# Altium footprint library Connectors.PcbLib: 131 footprints (part 2 of 9)
Each footprint in its own frame and in the unit in brackets; x right, y up, seen from the top. Pads: shape width x height; smd on the part's side, far side on the other; paste and mask are expansions set on the pad; w line width, h text height; cw(c..) or ccw(c..) is an arc to the next point about the centre after c.
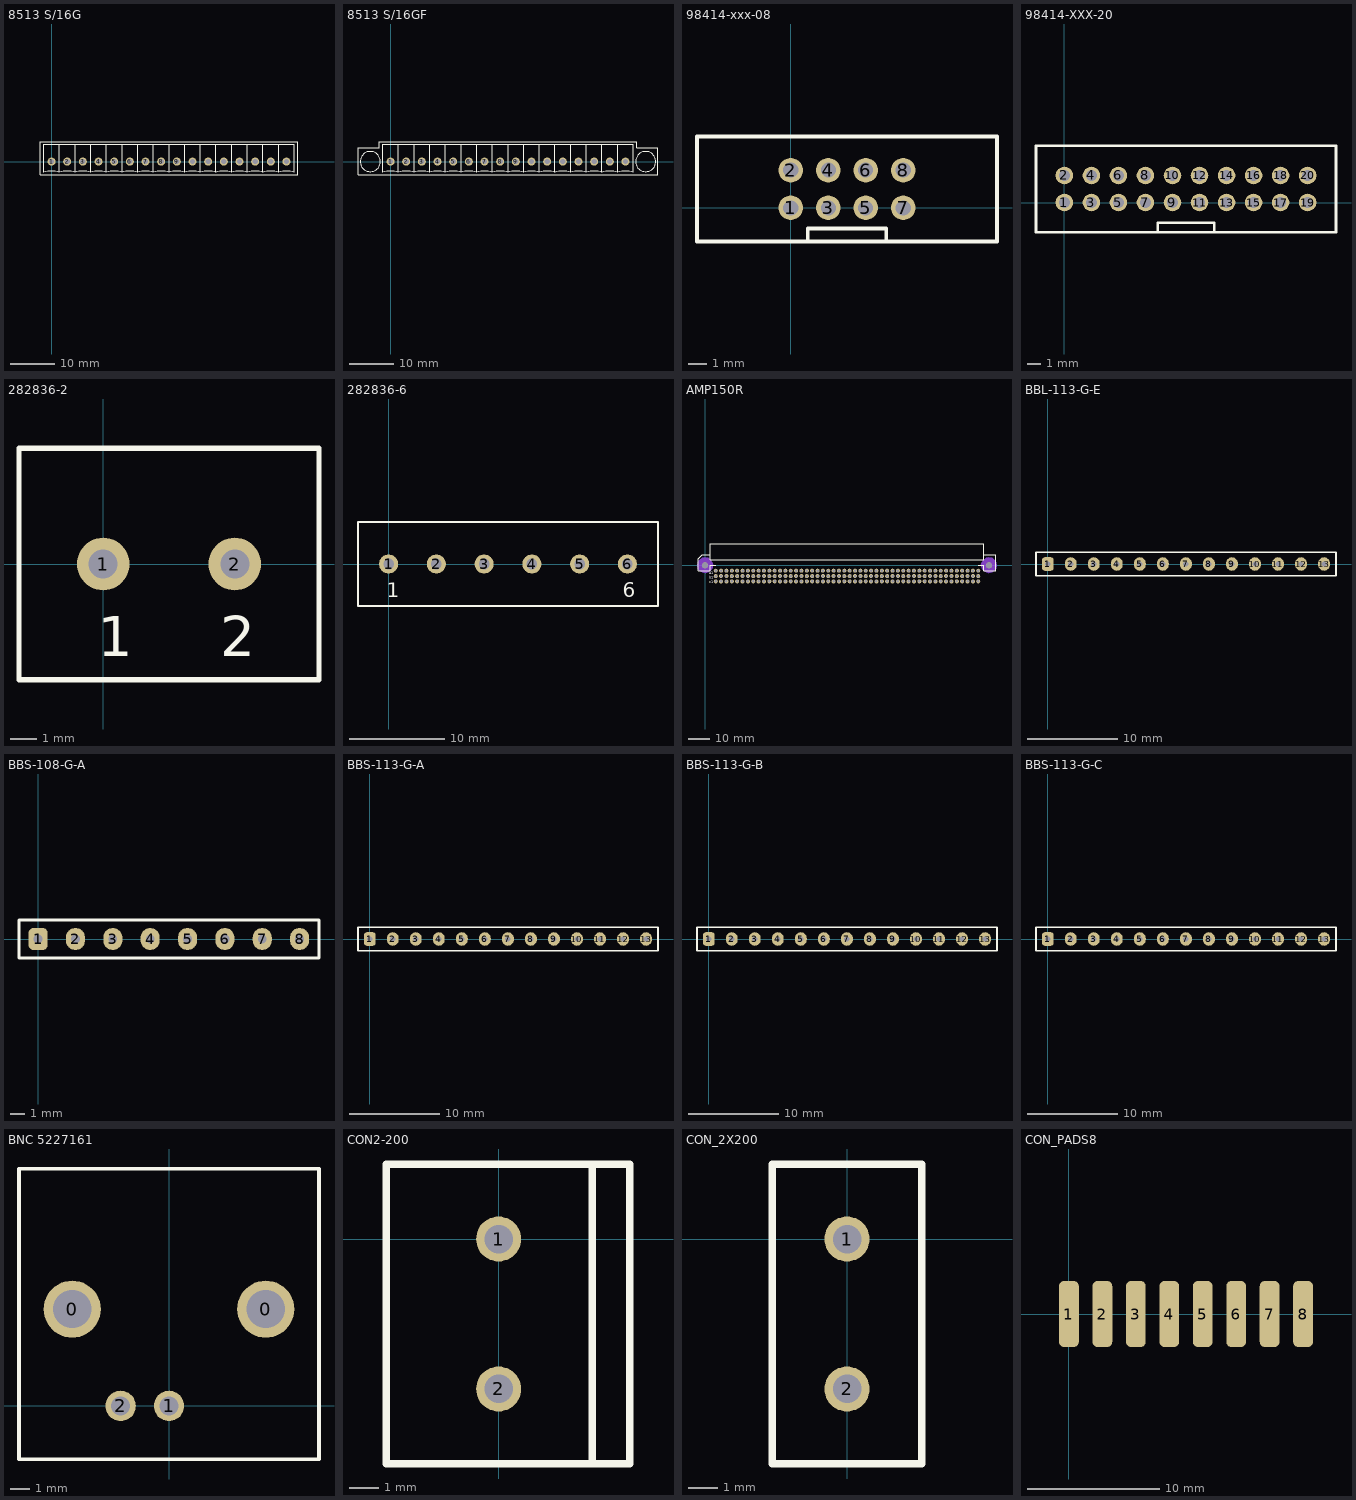
[diagram p1: the footprints below, top view; thin cyan lines are the x and y axes]

## 8513 S/16G [mm]
pads (16):
  round 1.8 hole 1.2: 1(0,0) 2(3.5,0) 3(7,0) 4(10.5,0) 5(14,0) 6(17.5,0) 7(21,0) 8(24.5,0) 9(28,0) 10(31.5,0) 11(35,0) 12(38.5,0) 13(42,0) 14(45.5,0) 15(49,0) 16(52.5,0)
Top Overlay:
  lines w0.254: -1.75,-2.35 -1.75,3.85 53.85,3.85 54.25,3.85 54.25,-2.35 ; -1.745,-2.349 cw(c0,-9.4) 1.745,-2.349 ; 1.75,-2.35 1.75,3.85 ; 1.755,-2.349 cw(c3.5,-9.4) 5.245,-2.349 ; 5.25,-2.35 5.25,3.85 ; 5.255,-2.349 cw(c7,-9.4) 8.745,-2.349 ; 8.75,-2.35 8.75,3.85 ; 8.755,-2.349 cw(c10.5,-9.4) 12.245,-2.349 ; 12.25,-2.35 12.25,3.85 ; 12.255,-2.349 cw(c14,-9.4) 15.745,-2.349 ; 15.75,-2.35 15.75,3.85 ; 15.755,-2.349 cw(c17.5,-9.4) 19.245,-2.349 ; 19.25,-2.35 19.25,3.85 ; 19.255,-2.349 cw(c21,-9.4) 22.745,-2.349 ; 22.75,-2.35 22.75,3.85 ; 22.755,-2.349 cw(c24.5,-9.4) 26.245,-2.349 ; 26.25,-2.35 26.25,3.85 ; 26.255,-2.349 cw(c28,-9.4) 29.745,-2.349 ; 29.75,-2.35 29.75,3.85 ; 29.755,-2.349 cw(c31.5,-9.4) 33.245,-2.349 ; 33.25,-2.35 33.25,3.85 ; 33.255,-2.349 cw(c35,-9.4) 36.745,-2.349 ; 36.75,-2.35 36.75,3.85 ; 36.755,-2.349 cw(c38.5,-9.4) 40.245,-2.349 ; 40.25,-2.35 40.25,3.85 ; 40.255,-2.349 cw(c42,-9.4) 43.745,-2.349 ; 43.75,-2.35 43.75,3.85 ; 43.755,-2.349 cw(c45.5,-9.4) 47.245,-2.349 ; 47.25,-2.35 47.25,3.85 ; 47.255,-2.349 cw(c49,-9.4) 50.745,-2.349 ; 50.75,-2.35 50.75,3.85 ; 50.755,-2.349 cw(c52.5,-9.4) 54.245,-2.349 ; -2.5,-2.9 55,-2.9 55,4.4 -2.5,4.4 -2.5,-2.9
Top Assembly:
  text ".Designator" at 31.248,0.417 h1

## 8513 S/16GF [mm]
pads (16):
  round 1.8 hole 1.2: 1(0,0) 2(3.5,0) 3(7,0) 4(10.5,0) 5(14,0) 6(17.5,0) 7(21,0) 8(24.5,0) 9(28,0) 10(31.5,0) 11(35,0) 12(38.5,0) 13(42,0) 14(45.5,0) 15(49,0) 16(52.5,0)
Top Overlay:
  circle w0.254: c57,0 r2.25
  circle w0.254: c-4.5,0 r2.25
  lines w0.254: -1.75,-2.35 -1.75,3.85 53.85,3.85 54.25,3.85 54.25,-2.35 ; -1.745,-2.349 cw(c0,-9.4) 1.745,-2.349 ; 1.75,-2.35 1.75,3.85 ; 1.755,-2.349 cw(c3.5,-9.4) 5.245,-2.349 ; 5.25,-2.35 5.25,3.85 ; 5.255,-2.349 cw(c7,-9.4) 8.745,-2.349 ; 8.75,-2.35 8.75,3.85 ; 8.755,-2.349 cw(c10.5,-9.4) 12.245,-2.349 ; 12.25,-2.35 12.25,3.85 ; 12.255,-2.349 cw(c14,-9.4) 15.745,-2.349 ; 15.75,-2.35 15.75,3.85 ; 15.755,-2.349 cw(c17.5,-9.4) 19.245,-2.349 ; 19.25,-2.35 19.25,3.85 ; 19.255,-2.349 cw(c21,-9.4) 22.745,-2.349 ; 22.75,-2.35 22.75,3.85 ; 22.755,-2.349 cw(c24.5,-9.4) 26.245,-2.349 ; 26.25,-2.35 26.25,3.85 ; 26.255,-2.349 cw(c28,-9.4) 29.745,-2.349 ; 29.75,-2.35 29.75,3.85 ; 29.755,-2.349 cw(c31.5,-9.4) 33.245,-2.349 ; 33.25,-2.35 33.25,3.85 ; 33.255,-2.349 cw(c35,-9.4) 36.745,-2.349 ; 36.75,-2.35 36.75,3.85 ; 36.755,-2.349 cw(c38.5,-9.4) 40.245,-2.349 ; 40.25,-2.35 40.25,3.85 ; 40.255,-2.349 cw(c42,-9.4) 43.745,-2.349 ; 43.75,-2.35 43.75,3.85 ; 43.755,-2.349 cw(c45.5,-9.4) 47.245,-2.349 ; 47.25,-2.35 47.25,3.85 ; 47.255,-2.349 cw(c49,-9.4) 50.745,-2.349 ; 50.75,-2.35 50.75,3.85 ; 50.755,-2.349 cw(c52.5,-9.4) 54.245,-2.349 ; -7.2,-2.9 59.7,-2.9 59.7,3.1 55,3.1 55,4.4 -2.5,4.4 -2.5,3.1 -7.2,3.1 -7.2,-2.9
Top Assembly:
  text ".Designator" at 31.248,0.417 h1
3D body "Wieland_25.646.4653.0_CAD STEP data.STP": height 9.3, standoff -3.4, extent -6.94,-2.9 59.46,4.25

## 98414-xxx-08 [mm]
pads (8):
  round 1.3 hole 0.8: 1(0,0) 2(0,2) 3(2,0) 4(2,2) 5(4,0) 6(4,2) 7(6,0) 8(6,2)
Top Overlay:
  lines w0.2: 0.9,-1.8 0.9,-1.1 5.1,-1.1 5.1,-1.8 ; -5,-1.8 -5,3.8 11,3.8 11,-1.8 -5,-1.8
Top Assembly:
  text ".Designator" at 7.998,0.672 h1
3D body "98414-f06-08lf.stp": height 5.85, standoff -2.5, extent -1.99,-2.045 8.01,4.055

## 98414-XXX-20 [mm]
pads (20):
  round 1.3 hole 0.8: 1(0,0) 2(0,2) 3(2,0) 4(2,2) 5(4,0) 6(4,2) 7(6,0) 8(6,2) 9(8,0) 10(8,2) 11(10,0) 12(10,2) 13(12,0) 14(12,2) 15(14,0) 16(14,2) 17(16,0) 18(16,2) 19(18,0) 20(18,2)
Top Overlay:
  lines w0.2: 6.9,-2.2 6.9,-1.5 11.1,-1.5 11.1,-2.2 ; -2.1,-2.2 -2.1,4.2 20.1,4.2 20.1,-2.2 -2.1,-2.2
Top Assembly:
  text ".Designator" at 13.998,0.667 h1
3D body "98414g0620ulf.stp": height 5.85, standoff -2.5, extent -2,-2.05 20,4.05

## 282836-2 [mm]
pads (2):
  round 2 hole 1.1: 1(0,0) 2(5,0)
Top Overlay:
  lines w0.2: -3.2,-4.4 8.2,-4.4 8.2,4.4 -3.2,4.4 -3.2,-4.4
  text "2" at 4.45,-3.5 h1.52
  text "1" at -0.2,-3.5 h1.52
Top Assembly:
  text ".Designator" at 7.498,-0.333 h1
3D body "c-282836-2-h-3d.stp": height 10, standoff -3.5, extent -3.1,-4.1 7.5,4.1

## 282836-6 [mm]
pads (6):
  round 2 hole 1.1: 1(0,0) 2(5,0) 3(10,0) 4(15,0) 5(20,0) 6(25,0)
Top Overlay:
  lines w0.2: -3.2,-4.4 28.2,-4.4 28.2,4.4 -3.2,4.4 -3.2,-4.4
  text "6" at 24.5,-3.5 h1.52
  text "1" at -0.2,-3.5 h1.52
Top Assembly:
  text ".Designator" at 17.498,-0.333 h1
3D body "c-282836-6-h-3d.stp": height 10, standoff -3.5, extent -3.1,-4.1 27.5,4.1

## AMP150R [mm]
pads (152):
  round 1.9 hole 1.2: 1(5.08,-2.54) 2(7.62,-2.54) 3(10.16,-2.54) 4(12.7,-2.54) 5(15.24,-2.54) 6(17.78,-2.54) 7(20.32,-2.54) 8(22.86,-2.54) 9(25.4,-2.54) 10(27.94,-2.54) 11(30.48,-2.54) 12(33.02,-2.54) 13(35.56,-2.54) 14(38.1,-2.54) 15(40.64,-2.54) 16(43.18,-2.54) 17(45.72,-2.54) 18(48.26,-2.54) 19(50.8,-2.54) 20(53.34,-2.54) 21(55.88,-2.54) 22(58.42,-2.54) 23(60.96,-2.54) 24(63.5,-2.54) 25(66.04,-2.54) 26(68.58,-2.54) 27(71.12,-2.54) 28(73.66,-2.54) 29(76.2,-2.54) 30(78.74,-2.54) 31(81.28,-2.54) 32(83.82,-2.54) 33(86.36,-2.54) 34(88.9,-2.54) 35(91.44,-2.54) 36(93.98,-2.54) 37(96.52,-2.54) 38(99.06,-2.54) 39(101.6,-2.54) 40(104.14,-2.54) 41(106.68,-2.54) 42(109.22,-2.54) 43(111.76,-2.54) 44(114.3,-2.54) 45(116.84,-2.54) 46(119.38,-2.54) 47(121.92,-2.54) 48(124.46,-2.54) 49(127,-2.54) 50(129.54,-2.54) 51(5.08,-5.08) 52(7.62,-5.08) 53(10.16,-5.08) 54(12.7,-5.08) 55(15.24,-5.08) 56(17.78,-5.08) 57(20.32,-5.08) 58(22.86,-5.08) 59(25.4,-5.08) 60(27.94,-5.08) 61(30.48,-5.08) 62(33.02,-5.08) 63(35.56,-5.08) 64(38.1,-5.08) 65(40.64,-5.08) 66(43.18,-5.08) 67(45.72,-5.08) 68(48.26,-5.08) 69(50.8,-5.08) 70(53.34,-5.08) 71(55.88,-5.08) 72(58.42,-5.08) 73(60.96,-5.08) 74(63.5,-5.08) 75(66.04,-5.08) 76(68.58,-5.08) 77(71.12,-5.08) 78(73.66,-5.08) 79(76.2,-5.08) 80(78.74,-5.08) 81(81.28,-5.08) 82(83.82,-5.08) 83(86.36,-5.08) 84(88.9,-5.08) 85(91.44,-5.08) 86(93.98,-5.08) 87(96.52,-5.08) 88(99.06,-5.08) 89(101.6,-5.08) 90(104.14,-5.08) 91(106.68,-5.08) 92(109.22,-5.08) 93(111.76,-5.08) 94(114.3,-5.08) 95(116.84,-5.08) 96(119.38,-5.08) 97(121.92,-5.08) 98(124.46,-5.08) 99(127,-5.08) 100(129.54,-5.08) 101(5.08,-7.62) 102(7.62,-7.62) 103(10.16,-7.62) 104(12.7,-7.62) 105(15.24,-7.62) 106(17.78,-7.62) 107(20.32,-7.62) 108(22.86,-7.62) 109(25.4,-7.62) 110(27.94,-7.62) 111(30.48,-7.62) 112(33.02,-7.62) 113(35.56,-7.62) 114(38.1,-7.62) 115(40.64,-7.62) 116(43.18,-7.62) 117(45.72,-7.62) 118(48.26,-7.62) 119(50.8,-7.62) 120(53.34,-7.62) 121(55.88,-7.62) 122(58.42,-7.62) 123(60.96,-7.62) 124(63.5,-7.62) 125(66.04,-7.62) 126(68.58,-7.62) 127(71.12,-7.62) 128(73.66,-7.62) 129(76.2,-7.62) 130(78.74,-7.62) 131(81.28,-7.62) 132(83.82,-7.62) 133(86.36,-7.62) 134(88.9,-7.62) 135(91.44,-7.62) 136(93.98,-7.62) 137(96.52,-7.62) 138(99.06,-7.62) 139(101.6,-7.62) 140(104.14,-7.62) 141(106.68,-7.62) 142(109.22,-7.62) 143(111.76,-7.62) 144(114.3,-7.62) 145(116.84,-7.62) 146(119.38,-7.62) 147(121.92,-7.62) 148(124.46,-7.62) 149(127,-7.62) 150(129.54,-7.62)
  round 2.8 hole 2.8 unplated: 151(0,0) 152(134.62,0)
Top Layer keep-out:
  region: -3.81,0 -3.5,-0.96 -3.2,-1.86 -2.54,-2.54 -1.4,-3.36 0,-3.81 1.6,-3.36 2.54,-2.54 3.4,-1.56 3.81,0 3.4,1.44 2.54,2.54 1.6,3.54 0,3.81 -1.4,3.54 -2.54,2.54 -3.5,1.44
  region: 130.81,0 131.12,-0.96 131.42,-1.86 132.08,-2.54 133.22,-3.36 134.62,-3.81 136.22,-3.36 137.16,-2.54 138.02,-1.56 138.43,0 138.02,1.44 137.16,2.54 136.22,3.54 134.62,3.81 133.22,3.54 132.08,2.54 131.12,1.44
Mid-Layer 1:
  lines w0.3: 2.54,5.08 -1.27,5.08 -3.175,3.175 -3.175,-2.54 2.54,-2.54 2.54,0 5.08,0 5.08,-7.62 129.54,-7.62 129.54,0 132.08,0 132.08,-2.54 137.795,-2.54 ; 132.08,5.08 137.795,5.08 ; 137.825,-2.54 137.825,5.08 ; 2.54,2.54 2.54,10.16 132.08,10.16 132.08,2.54 2.54,2.54
Bottom Layer keep-out:
  region: -3.81,0 -3.5,-1.26 -3.2,-1.86 -2.54,-2.54 -1.4,-3.36 0,-3.81 1.6,-3.36 2.54,-2.54 3.4,-1.56 3.81,0 3.4,1.44 2.54,2.54 1.6,3.54 0,3.81 -1.4,3.54 -2.54,2.54 -3.5,1.44
  region: 130.81,0 131.12,-1.26 131.42,-1.86 132.08,-2.54 133.22,-3.36 134.62,-3.81 136.22,-3.36 137.16,-2.54 138.02,-1.56 138.43,0 138.02,1.44 137.16,2.54 136.22,3.54 134.62,3.81 133.22,3.54 132.08,2.54 131.12,1.44
Top Overlay:
  lines w0.3: 2.54,5.08 -1.27,5.08 -3.175,3.175 -3.175,-2.54 2.54,-2.54 2.54,0 5.08,0 ; 129.54,0 132.08,0 132.08,-2.54 137.795,-2.54 ; 132.08,5.08 137.795,5.08 ; 137.825,-2.54 137.825,5.08 ; 2.54,2.54 2.54,10.16 132.08,10.16 132.08,2.54 2.54,2.54
  text "a1" at 1.905,-4.64 h2
  text "b1" at 1.905,-6.765 h2
  text "c1" at 1.905,-8.89 h2
Top Assembly:
  text ".Designator" at 72.308,0.367 h1

## BBL-113-G-E [mm]
height 2.54
pads (13):
  rrect50% 1.3x1.5 hole 0.6: 1(0,0)
  oval 1.3x1.5 hole 0.6: 2(2.54,0) 3(5.08,0) 4(7.62,0) 5(10.16,0) 6(12.7,0) 7(15.24,0) 8(17.78,0) 9(20.32,0) 10(22.86,0) 11(25.4,0) 12(27.94,0) 13(30.48,0)
Top Overlay:
  lines w0.2: -1.3,-1.3 -1.3,1.3 31.8,1.3 31.8,-1.3 -1.3,-1.3
Top Assembly:
  text ".Designator" at 10.242,-0.333 h1
3D body "Samtec-BBL-113-G-E.step": height 4.51, standoff -3.18, extent -1.27,-1.27 31.75,1.27

## BBS-108-G-A [mm]
height 2.54
pads (8):
  rrect50% 1.3x1.5 hole 0.6: 1(0,0)
  oval 1.3x1.5 hole 0.6: 2(2.54,0) 3(5.08,0) 4(7.62,0) 5(10.16,0) 6(12.7,0) 7(15.24,0) 8(17.78,0)
Top Overlay:
  lines w0.2: -1.3,-1.3 -1.3,1.3 19.1,1.3 19.1,-1.3 -1.3,-1.3
Top Assembly:
  text ".Designator" at 3.892,-0.333 h1
3D body "Samtec-BBS-108-G-A.step": height 8.51, standoff -3.17, extent -1.26,-1.27 19.06,1.27

## BBS-113-G-A [mm]
height 2.54
pads (13):
  rrect50% 1.3x1.5 hole 0.6: 1(0,0)
  oval 1.3x1.5 hole 0.6: 2(2.54,0) 3(5.08,0) 4(7.62,0) 5(10.16,0) 6(12.7,0) 7(15.24,0) 8(17.78,0) 9(20.32,0) 10(22.86,0) 11(25.4,0) 12(27.94,0) 13(30.48,0)
Top Overlay:
  lines w0.2: -1.3,-1.3 31.8,-1.3 31.8,1.3 -1.3,1.3 -1.3,-1.3
Top Assembly:
  text ".Designator" at 10.242,-0.333 h1
3D body "Samtec-BBS-113-G-A.step": height 8.51, standoff -3.17, extent -1.26,-1.27 31.76,1.27

## BBS-113-G-B [mm]
height 2.54
pads (13):
  rrect50% 1.3x1.5 hole 0.6: 1(0,0)
  oval 1.3x1.5 hole 0.6: 2(2.54,0) 3(5.08,0) 4(7.62,0) 5(10.16,0) 6(12.7,0) 7(15.24,0) 8(17.78,0) 9(20.32,0) 10(22.86,0) 11(25.4,0) 12(27.94,0) 13(30.48,0)
Top Overlay:
  lines w0.2: -1.3,-1.3 31.8,-1.3 31.8,1.3 -1.3,1.3 -1.3,-1.3
Top Assembly:
  text ".Designator" at 10.242,-0.333 h1
3D body "Samtec-BBS-113-G-B.step": height 11.67, standoff -3.18, extent -1.26,-1.27 31.76,1.27

## BBS-113-G-C [mm]
height 2.54
pads (13):
  rrect50% 1.3x1.5 hole 0.6: 1(0,0)
  oval 1.3x1.5 hole 0.6: 2(2.54,0) 3(5.08,0) 4(7.62,0) 5(10.16,0) 6(12.7,0) 7(15.24,0) 8(17.78,0) 9(20.32,0) 10(22.86,0) 11(25.4,0) 12(27.94,0) 13(30.48,0)
Top Overlay:
  lines w0.2: -1.3,-1.3 -1.3,1.3 31.8,1.3 31.8,-1.3 -1.3,-1.3
Top Assembly:
  text ".Designator" at 10.242,-0.333 h1
3D body "Samtec-BBS-113-G-C.step": height 17.71, standoff -3.49, extent -1.27,-1.26 31.75,1.28

## BNC 5227161 [mm]
pads (4):
  round 3 hole 2: 0(-5.08,5.08) 0(5.08,5.08)
  round 1.6 hole 1: 1(0,0) 2(-2.54,0)
Top Overlay:
  lines w0.2: -7.874,-2.794 7.874,-2.794 7.874,12.446 -7.874,12.446 -7.874,-2.794
Top Assembly:
  text ".Designator" at 4.998,14.603 h1
3D body "SW3dPS-227161-2.STEP": height 15.89, standoff -3.59, extent -7.379,-2.286 7.379,32.766

## CON2-200 [mil]
pads (2):
  round 60 hole 38: 1(0,0) 2(0,-200)
Top Overlay:
  lines w10: 125,-300 125,100 ; -150,-300 175,-300 175,100 -150,100 -150,-300
Top Assembly:
  text ".Designator" at 209.29,-113.12 h39.37

## CON_2X200 [mil]
pads (2):
  round 60 hole 38: 1(0,0) 2(0,-200)
Top Overlay:
  lines w10: -100,-300 100,-300 100,100 -100,100 -100,-300
Top Assembly:
  text ".Designator" at 196.79,-113.12 h39.37

## CON_PADS8 [mm]
pads (8):
  rrect50% 1.5x5 smd: 1(0,0) 2(2.54,0) 3(5.08,0) 4(7.62,0) 5(10.16,0) 6(12.7,0) 7(15.24,0) 8(17.78,0)
Top Assembly:
  text ".Designator" at 13.888,-0.333 h1